# Altium footprint library SMT.PcbLib: 379 footprints (part 16 of 24)
Each footprint in its own frame and in the unit in brackets; x right, y up, seen from the top. Pads: shape width x height; smd on the part's side, far side on the other; paste and mask are expansions set on the pad; w line width, h text height; cw(c..) or ccw(c..) is an arc to the next point about the centre after c.
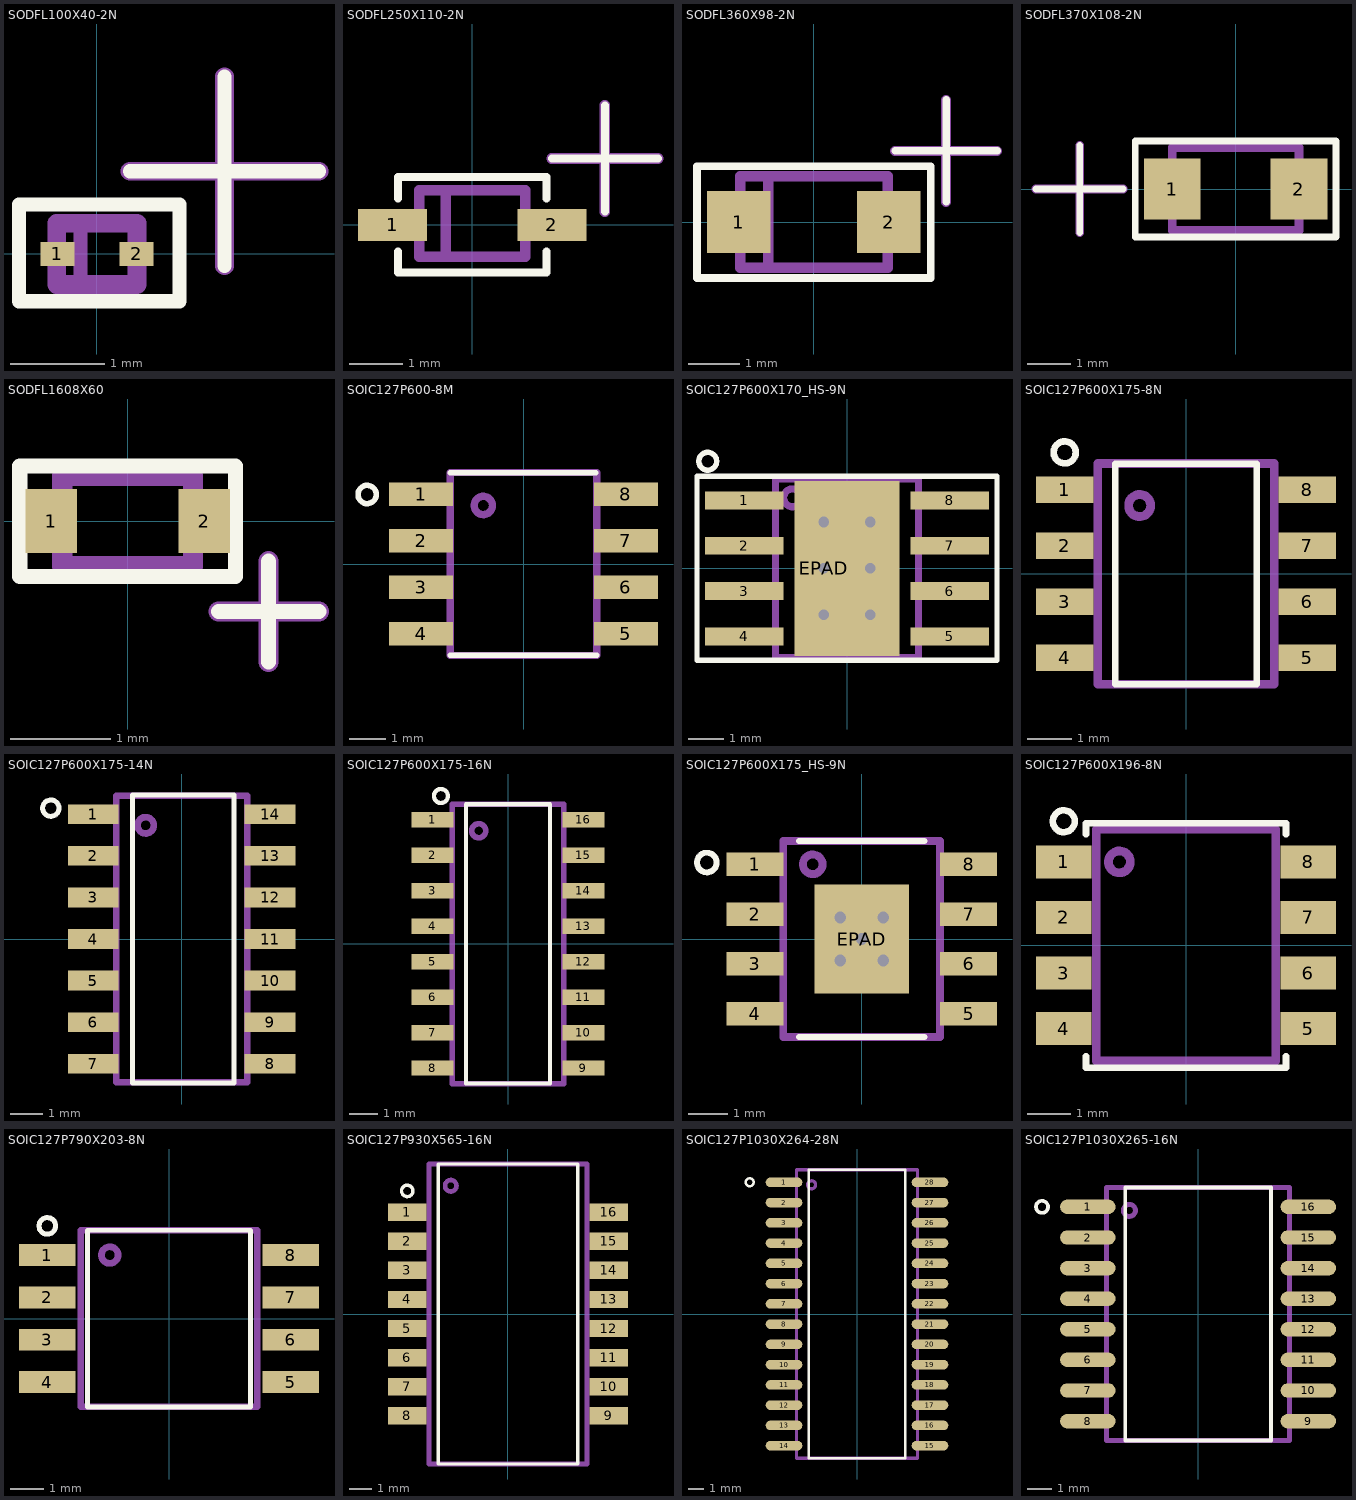
[diagram p15: the footprints below, top view; thin cyan lines are the x and y axes]

## SODFL100X40-2N [mm] "SODFL, 2-Leads, Body 0,60x1,00mm, IPC Medium Density"
height 0.4
pads (2):
  rect 0.36x0.25 smd mask+0.05: 1(-0.42,0) 2(0.42,0)
Top Overlay:
  lines w0.15: 0.35,0.875 2.35,0.875 ; 1.35,-0.125 1.35,1.875 ; -0.825,-0.5 0.875,-0.5 0.875,0.525 -0.825,0.525 -0.825,-0.5
Mechanical 1:
  lines w0.15: -0.175,-0.325 -0.175,0.325
  lines w0.2: 0.35,0.875 2.35,0.875 ; 1.35,-0.125 1.35,1.875 ; -0.425,-0.325 -0.425,0.325 0.425,0.325 0.425,-0.325 -0.425,-0.325
3D body "SODFL100X40-2N.step": height 0.4, standoff 0, extent -0.5,-0.325 0.5,0.325

## SODFL250X110-2N [mm] "SODFL, 2-Leads, Body 1,30x2,50mm, IPC Medium Density"
height 1.1
pads (2):
  rect 1.3x0.6 smd: 1(-1.5,0) 2(1.5,0)
Top Overlay:
  lines w0.15: -1.4,-0.5 -1.4,-0.9 1.4,-0.9 1.4,-0.5 ; -1.4,0.5 -1.4,0.9 1.4,0.9 1.4,0.5 ; 1.5,1.25 3.5,1.25 ; 2.5,0.25 2.5,2.25
Mechanical 1:
  lines w0.2: -1.25,0 -1,0 ; -0.5,-0.6 -0.5,0.65 ; 1,0 1.25,0 ; 1.5,1.25 3.5,1.25 ; 2.5,0.25 2.5,2.25 ; -1,-0.6 1,-0.6 1,0.65 -1,0.65 -1,-0.6
3D body "User Library-SOD323-1.STEP": height 1.06, standoff -0.04, extent -1.306,-0.675 1.294,0.675

## SODFL360X98-2N [mm] "SODFL, 2-Leads, Body 1,65x3,60mm, IPC Medium Density"
height 0.98
pads (2):
  rect 1.25x1.22 smd: 1(-1.475,0) 2(1.475,0)
Top Overlay:
  lines w0.15: 1.6,1.4 3.6,1.4 ; 2.6,0.4 2.6,2.4 ; -2.3,-1.1 2.3,-1.1 2.3,1.1 -2.3,1.1 -2.3,-1.1
Mechanical 1:
  lines w0.2: -0.9,-0.9 -0.9,0.9 ; 1.6,1.4 3.6,1.4 ; 2.6,0.4 2.6,2.4 ; -1.45,-0.9 -1.45,0.9 1.45,0.9 1.45,-0.9 -1.45,-0.9
3D body "SODFL360X98-2N.step": height 0.98, standoff 0, extent -1.8,-0.9 1.8,0.9

## SODFL370X108-2N [mm] "SODFL, 2-Leads, Body 1,80x3,70mm, IPC Medium Density"
height 1.08
pads (2):
  rect 1.3x1.4 smd: 1(-1.45,0) 2(1.45,0)
Top Overlay:
  lines w0.15: -4.575,0 -2.575,0 ; -3.575,-1 -3.575,1 ; -2.3,-1.1 -2.3,1.1 2.3,1.1 2.3,-1.1 -2.3,-1.1
Mechanical 1:
  lines w0.2: -4.575,0 -2.575,0 ; -3.575,-1 -3.575,1 ; -1.45,-0.95 -1.45,0.95 1.45,0.95 1.45,-0.95 -1.45,-0.95
3D body "SODFL370X108-2N.step": height 1.08, standoff 0, extent -1.85,-0.95 1.85,0.95

## SODFL1608X60 [mm] "SODFL Diode 0.8mm W X 1.2 mm L X 0.6 mm H"
height 0.7
pads (2):
  rect 0.51x0.64 smd paste+0: 1(-0.76,0) 2(0.76,0)
Top Overlay:
  lines w0.15: 0.9,-0.9 1.9,-0.9 ; 1.4,-1.4 1.4,-0.4 ; -1.073,-0.552 -1.073,0.546 1.07,0.546 1.07,-0.552 -1.073,-0.552
Mechanical 1:
  lines w0.2: -0.85,0 -0.65,0 ; 0.65,0 0.85,0 ; 0.9,-0.9 1.9,-0.9 ; 1.4,-1.4 1.4,-0.4 ; -0.65,-0.45 -0.65,0.45 0.65,0.45 0.65,-0.45 -0.65,-0.45
3D body "User Library-SC79.STEP": height 0.62, standoff 0, extent -0.85,-0.45 0.85,0.45

## SOIC127P600-8M [mm] "SOIC, 8-Leads, Body 4.9x3.9mm, Pitch 1.27mm, IPC Low Density"
height 1.75
pads (8):
  rect 1.75x0.65 smd: 1(-2.8,1.905) 2(-2.8,0.635) 3(-2.8,-0.635) 4(-2.8,-1.905) 5(2.8,-1.905) 6(2.8,-0.635) 7(2.8,0.635) 8(2.8,1.905)
Top Overlay:
  circle w0.15: c-4.275,1.9 r0.25
  lines w0.15: -2,-2.5 2,-2.5 ; -2,2.5 1.975,2.5
Mechanical 1:
  circle w0.2: c-1.1,1.6 r0.25
  lines w0.2: -2,-2.5 2,-2.5 2,2.5 -2,2.5 -2,-2.5
3D body "SOIC127P600-8.STEP": height 1.7, standoff 0, extent -3,-2.54 3,2.54

## SOIC127P600X170_HS-9N [mm] "SOIC, 8-Leads, Body 4,90x3,90mm, Pitch 1,27mm, Thermal Pad 3,10x2,40mm, IPC Medium Density"
height 1.7
pads (9):
  rect 2.2x0.5 smd paste-0.025 mask+0.07: 1(-2.875,1.905) 2(-2.875,0.635) 3(-2.875,-0.635) 4(-2.875,-1.905) 5(2.875,-1.905) 6(2.875,-0.635) 7(2.875,0.635) 8(2.875,1.905)
  rect 2.95x4.9 hole 0.3 copper offset 0.65,0 paste-15: EPAD(-0.65,0)
via 0.65,-1.3 diameter 0.5 hole 0.3
via -0.65,-1.3 diameter 0.5 hole 0.3
via 0.65,0 diameter 0.5 hole 0.3
via 0.65,1.3 diameter 0.5 hole 0.3
via -0.65,1.3 diameter 0.5 hole 0.3
Top Overlay:
  circle w0.15: c-3.9,3 r0.25
  lines w0.15: -4.2,-2.575 4.2,-2.575 4.2,2.575 -4.2,2.575 -4.2,-2.575
Top Paste:
  region: -1.05,1.4 1.05,1.4 1.05,-1.4 -1.05,-1.4
Top Solder:
  region: -1.2,-1.55 -1.2,1.55 1.2,1.55 1.2,-1.55
Mechanical 1:
  circle w0.2: c-1.525,1.975 r0.25
  lines w0.2: -2,-2.5 2,-2.5 2,2.5 -2,2.5 -2,-2.5
3D body "User Library-TPS54360DDA.STEP": height 1.55, standoff -0.04, extent -3.1,-2.5 3.1,2.5

## SOIC127P600X175-8N [mm] "SOIC, 8-Leads, Body 4,90x3,90mm, Pitch 1,27mm, IPC Medium Density"
height 1.75
pads (8):
  rect 1.3x0.6 smd: 1(-2.75,1.905) 2(-2.75,0.635) 3(-2.75,-0.635) 4(-2.75,-1.905) 5(2.75,-1.905) 6(2.75,-0.635) 7(2.75,0.635) 8(2.75,1.905)
Top Overlay:
  circle w0.15: c-2.75,2.755 r0.25
  lines w0.15: -1.6,-2.5 1.6,-2.5 1.6,2.5 -1.6,2.5 -1.6,-2.5
Mechanical 1:
  circle w0.2: c-1.05,1.55 r0.25
  lines w0.2: -2,-2.5 2,-2.5 2,2.5 -2,2.5 -2,-2.5
3D body "SOIC127P600X175-8N.step": height 1.75, standoff 0, extent -3,-2.5 3,2.5

## SOIC127P600X175-14N [mm] "SOIC, 14-Leads, Body 8.7x3.9mm, Pitch 1.27mm, IPC Medium Density"
height 1.75
pads (14):
  rect 1.55x0.6 smd: 1(-2.7,3.81) 2(-2.7,2.54) 3(-2.7,1.27) 4(-2.7,0) 5(-2.7,-1.27) 6(-2.7,-2.54) 7(-2.7,-3.81) 8(2.7,-3.81) 9(2.7,-2.54) 10(2.7,-1.27) 11(2.7,0) 12(2.7,1.27) 13(2.7,2.54) 14(2.7,3.81)
Top Overlay:
  circle w0.15: c-4,4 r0.25
  lines w0.15: -1.5,-4.4 1.6,-4.4 1.6,4.4 -1.5,4.4 -1.5,-4.4
Mechanical 1:
  circle w0.2: c-1.1,3.475 r0.25
  lines w0.2: -2,-4.375 2,-4.375 2,4.375 -2,4.375 -2,-4.375
3D body "SOIC127P600-14.STEP": height 1.72, standoff 0.02, extent -3,-4.445 3,4.445

## SOIC127P600X175-16N [mm] "SOIC, 16-Leads, Body 10,0x4,0mm (max), Pitch 1,27mm, IPC Medium Density"
height 1.75
pads (16):
  rect 1.5x0.55 smd: 1(-2.7,4.445) 2(-2.7,3.175) 3(-2.7,1.905) 4(-2.7,0.635) 5(-2.7,-0.635) 6(-2.7,-1.905) 7(-2.7,-3.175) 8(-2.7,-4.445) 9(2.7,-4.445) 10(2.7,-3.175) 11(2.7,-1.905) 12(2.7,-0.635) 13(2.7,0.635) 14(2.7,1.905) 15(2.7,3.175) 16(2.7,4.445)
Top Overlay:
  circle w0.15: c-2.4,5.295 r0.25
  lines w0.15: -1.5,-5 -1.5,5 1.5,5 1.5,-5 -1.5,-5
Mechanical 1:
  circle w0.2: c-1.05,4.05 r0.25
  lines w0.2: -2,-5 -2,5 2,5 2,-5 -2,-5
3D body "SO16N.STEP": height 1.54, standoff 0.02, extent -3,-4.95 3,4.95

## SOIC127P600X175_HS-9N [mm] "SOIC, 8-Leads, Body 4,90x3,90mm, Pitch 1,27mm, Thermal Pad 2,79x2,41mm, IPC Medium Density"
height 1.75
pads (9):
  rect 1.45x0.6 smd: 1(-2.725,1.905) 2(-2.725,0.635) 3(-2.725,-0.635) 4(-2.725,-1.905) 5(2.725,-1.905) 6(2.725,-0.635) 7(2.725,0.635) 8(2.725,1.905)
  rect 2.41x2.79 hole 0.3: EPAD(0,0)
via 0.55,-0.55 diameter 0.6 hole 0.3
via -0.55,-0.55 diameter 0.6 hole 0.3
via 0.55,0.55 diameter 0.6 hole 0.3
via -0.55,0.55 diameter 0.6 hole 0.3
Top Overlay:
  circle w0.15: c-3.95,1.95 r0.25
  lines w0.15: -1.6,-2.5 1.6,-2.5 ; -1.6,2.5 1.6,2.5
Top Paste:
  rectangle: -0.7,-0.7 0.7,0.75
Mechanical 1:
  circle w0.2: c-1.25,1.905 r0.25
  lines w0.2: -2,-2.5 2,-2.5 2,2.5 -2,2.5 -2,-2.5
3D body "SO8N.STEP": height 1.53, standoff 0, extent -3,-2.45 3,2.45

## SOIC127P600X196-8N [mm] "SOIC, 8-Leads, Body 5,33x4,14mm, Pitch 1,27mm, IPC Medium Density"
height 1.96
pads (8):
  rect 1.27x0.76 smd: 1(-2.795,1.905) 2(-2.795,0.635) 3(-2.795,-0.635) 4(-2.795,-1.905) 5(2.795,-1.905) 6(2.795,-0.635) 7(2.795,0.635) 8(2.795,1.905)
Top Overlay:
  circle w0.15: c-2.795,2.835 r0.25
  lines w0.15: -2.286,-2.54 -2.286,-2.8 2.283,-2.8 2.286,-2.797 2.286,-2.54 ; -2.286,2.54 -2.286,2.794 2.286,2.794 2.286,2.54
Mechanical 1:
  circle w0.2: c-1.524,1.905 r0.25
  lines w0.2: -2.05,-2.65 -2.05,2.65 2.05,2.65 2.05,-2.65 -2.05,-2.65
3D body "SOIC127P600-8.STEP": height 1.7, standoff 0, extent -3,-2.54 3,2.54

## SOIC127P790X203-8N [mm] "SOIC, 8-Leads, Body 5,26x5,25mm, Pitch 1,27mm, IPC Medium Density"
height 2.03
pads (8):
  rect 1.7x0.65 smd mask+0.05: 1(-3.65,1.905) 2(-3.65,0.635) 3(-3.65,-0.635) 4(-3.65,-1.905) 5(3.65,-1.905) 6(3.65,-0.635) 7(3.65,0.635) 8(3.65,1.905)
Top Overlay:
  circle w0.15: c-3.65,2.78 r0.25
  lines w0.15: -2.45,-2.65 2.45,-2.65 2.45,2.65 -2.45,2.65 -2.45,-2.65
Mechanical 1:
  circle w0.2: c-1.778,1.905 r0.25
  lines w0.2: -2.65,-2.65 2.65,-2.65 2.65,2.65 -2.65,2.65 -2.65,-2.65
3D body "SOIC127P790X203-8N.step": height 2.03, standoff 0, extent -3.97,-2.65 3.97,2.65

## SOIC127P930X565-16N [mm] "SOIC, 16-Leads, Body 12,80x6,90mm, Pitch 1,27mm, IPC Medium Density"
height 5.65
pads (16):
  rect 1.7x0.76 smd: 1(-4.4,4.445) 2(-4.4,3.175) 3(-4.4,1.905) 4(-4.4,0.635) 5(-4.4,-0.635) 6(-4.4,-1.905) 7(-4.4,-3.175) 8(-4.4,-4.445) 9(4.4,-4.445) 10(4.4,-3.175) 11(4.4,-1.905) 12(4.4,-0.635) 13(4.4,0.635) 14(4.4,1.905) 15(4.4,3.175) 16(4.4,4.445)
Top Overlay:
  circle w0.15: c-4.4,5.375 r0.25
  lines w0.15: -3.05,-6.55 -3.05,6.55 3.05,6.55 3.05,-6.55 -3.05,-6.55
Mechanical 1:
  circle w0.2: c-2.5,5.6 r0.25
  lines w0.2: -3.45,-6.55 -3.45,6.55 3.45,6.55 3.45,-6.55 -3.45,-6.55
3D body "SOIC127P930X565-16N.step": height 5.65, standoff 0, extent -4.65,-6.55 4.65,6.55

## SOIC127P1030X264-28N [mm] "SOIC, 28-Leads, Body 17,86x7,46mm, Pitch 1,27mm, IPC Medium Density"
height 2.64
pads (28):
  oval 2.3x0.6 smd: 1(-4.575,8.255) 2(-4.575,6.985) 3(-4.575,5.715) 4(-4.575,4.445) 5(-4.575,3.175) 6(-4.575,1.905) 7(-4.575,0.635) 8(-4.575,-0.635) 9(-4.575,-1.905) 10(-4.575,-3.175) 11(-4.575,-4.445) 12(-4.575,-5.715) 13(-4.575,-6.985) 14(-4.575,-8.255) 15(4.575,-8.255) 16(4.575,-6.985) 17(4.575,-5.715) 18(4.575,-4.445) 19(4.575,-3.175) 20(4.575,-1.905) 21(4.575,-0.635) 22(4.575,0.635) 23(4.575,1.905) 24(4.575,3.175) 25(4.575,4.445) 26(4.575,5.715) 27(4.575,6.985) 28(4.575,8.255)
Top Overlay:
  circle w0.15: c-6.73,8.26 r0.25
  lines w0.15: -3.025,-9.05 -3.025,9.05 3.025,9.05 3.025,-9.05 -3.025,-9.05
Mechanical 1:
  circle w0.2: c-2.85,8.1 r0.25
  lines w0.2: -3.8,-9.05 -3.8,9.05 3.8,9.05 3.8,-9.05 -3.8,-9.05
3D body "SW3dPS-80072036 SO28.STEP": height 2.66, standoff 0.02, extent -5.335,-9.04 5.335,9.04

## SOIC127P1030X265-16N [mm] "SOIC, 16-Leads, Body 10,30x7,50mm, Pitch 1,27mm, IPC Medium Density"
height 2.65
pads (16):
  oval 2.3x0.6 smd: 1(-4.575,4.445) 2(-4.575,3.175) 3(-4.575,1.905) 4(-4.575,0.635) 5(-4.575,-0.635) 6(-4.575,-1.905) 7(-4.575,-3.175) 8(-4.575,-4.445) 9(4.575,-4.445) 10(4.575,-3.175) 11(4.575,-1.905) 12(4.575,-0.635) 13(4.575,0.635) 14(4.575,1.905) 15(4.575,3.175) 16(4.575,4.445)
Top Overlay:
  circle w0.15: c-6.477,4.445 r0.25
  lines w0.15: -3.025,-5.25 -3.025,5.25 3.025,5.25 3.025,-5.25 -3.025,-5.25
Mechanical 1:
  circle w0.2: c-2.85,4.3 r0.25
  lines w0.2: -3.8,-5.25 -3.8,5.25 3.8,5.25 3.8,-5.25 -3.8,-5.25
3D body "SO16W.STEP": height 2.57, standoff 0.02, extent -5.1,-5.15 5.2,5.15